# Altium footprint library GPS_GSM.PcbLib: 19 footprints (part 2 of 2)
Each footprint in its own frame and in the unit in brackets; x right, y up, seen from the top. Pads: shape width x height; smd on the part's side, far side on the other; paste and mask are expansions set on the pad; w line width, h text height; cw(c..) or ccw(c..) is an arc to the next point about the centre after c.
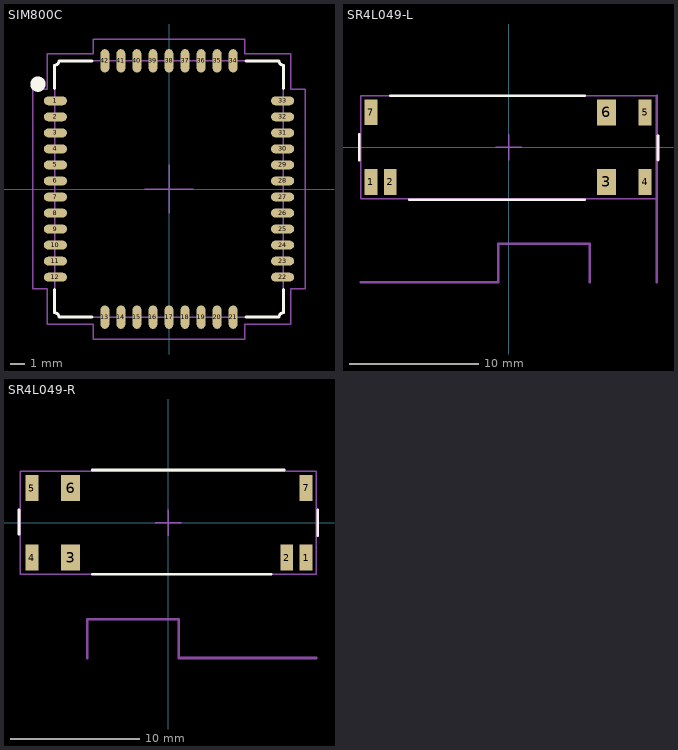
[diagram p1: the footprints below, top view; thin cyan lines are the x and y axes]

## SIM800C [mm]
pads (42):
  oval 1.6x0.6 smd mask+0.1: 1(-7.8,6.05) 2(-7.8,4.95) 3(-7.8,3.85) 4(-7.8,2.75) 5(-7.8,1.65) 6(-7.8,0.55) 7(-7.8,-0.55) 8(-7.8,-1.65) 9(-7.8,-2.75) 10(-7.8,-3.85) 11(-7.8,-4.95) 12(-7.8,-6.05) 22(7.8,-6.05) 23(7.8,-4.95) 24(7.8,-3.85) 25(7.8,-2.75) 26(7.8,-1.65) 27(7.8,-0.55) 28(7.8,0.55) 29(7.8,1.65) 30(7.8,2.75) 31(7.8,3.85) 32(7.8,4.95) 33(7.8,6.05)
  oval 0.6x1.6 smd mask+0.1: 13(-4.4,-8.8) 14(-3.3,-8.8) 15(-2.2,-8.8) 16(-1.1,-8.8) 17(0,-8.8) 18(1.1,-8.8) 19(2.2,-8.8) 20(3.3,-8.8) 21(4.4,-8.8) 34(4.4,8.8) 35(3.3,8.8) 36(2.2,8.8) 37(1.1,8.8) 38(0,8.8) 39(-1.1,8.8) 40(-2.2,8.8) 41(-3.3,8.8) 42(-4.4,8.8)
Top Overlay:
  circle w0.6: c-9,7.2 r0.224
  lines w0.2: -7.85,-6.9 -7.85,-8.5 cw(c-7.85,-8.8) -7.55,-8.8 -5.3,-8.8 ; -7.85,6.9 -7.85,8.5 ccw(c-7.85,8.8) -7.55,8.8 -5.3,8.8 ; 5.3,-8.8 7.55,-8.8 cw(c7.85,-8.8) 7.85,-8.5 7.85,-6.9 ; 5.3,8.8 7.55,8.8 ccw(c7.85,8.8) 7.85,8.5 7.85,6.9
Mechanical 15:
  lines w0.1: -1.65,0 0,0 ; 0,-1.65 0,0 ; 0,1.65 0,0 ; 1.65,0 0,0 ; -9.35,-6.85 -9.35,6.85 -8.35,6.85 -8.35,9.3 -5.2,9.3 -5.2,10.3 5.2,10.3 5.2,9.3 8.35,9.3 8.35,6.85 9.35,6.85 9.35,-6.85 8.35,-6.85 8.35,-9.3 5.2,-9.3 5.2,-10.3 -5.2,-10.3 -5.2,-9.3 -8.35,-9.3 -8.35,-6.85 -9.35,-6.85 ; -7.85,-8.5 cw(c-7.85,-8.8) -7.55,-8.8 7.55,-8.8 cw(c7.85,-8.8) 7.85,-8.5 7.85,8.5 cw(c7.85,8.8) 7.55,8.8 -7.55,8.8 cw(c-7.85,8.8) -7.85,8.5 -7.85,-8.5
3D body "SIM800C-1.STEP": height 2.35, standoff 0.01, extent -7.9,-8.8 7.8,8.8

## SR4L049-L [mm]
pads (7):
  rect 1x2 smd: 1(-10.7,-2.7) 2(-9.2,-2.7) 4(10.6,-2.7) 5(10.6,2.7) 7(-10.7,2.71)
  rect 1.5x2 smd: 3(7.6,-2.7) 6(7.6,2.7)
Top Overlay:
  lines w0.2: -11.6,-1 -11.6,1 ; -9.2,4 5.9,4 ; -7.7,-4.1 5.9,-4.1 ; 11.6,-1 11.6,0.9
Mechanical 15:
  lines w0.1: -1,0 0,0 ; 0,-1 0,0 ; 0,1 0,0 ; 1,0 0,0 ; -11.5,-4 -11.5,4 11.5,4 11.5,-4 -11.5,-4
  lines w0.2: -11.5,-10.5 -0.8,-10.5 -0.8,-7.5 6.3,-7.5 6.3,-10.5 ; 11.5,-10.5 11.5,4
3D body "SR4L049-L.STEP": height 3.31, standoff 0.02, extent -11.551,-4.009 11.449,3.991

## SR4L049-R [mm]
pads (7):
  rect 1x2 smd: 1(10.7,-2.7) 2(9.2,-2.7) 4(-10.6,-2.7) 5(-10.6,2.7) 7(10.7,2.71)
  rect 1.5x2 smd: 3(-7.6,-2.7) 6(-7.6,2.7)
Top Overlay:
  lines w0.2: -11.6,-0.9 -11.6,1 ; -5.9,-4 8,-4 ; -5.9,4.1 9,4.1 ; 11.6,-1 11.6,1
Mechanical 15:
  lines w0.1: -1,0 0,0 ; 0,-1 0,0 ; 0,1 0,0 ; 1,0 0,0 ; -11.5,-4 -11.5,4 11.5,4 11.5,-4 -11.5,-4
  lines w0.2: -6.3,-10.5 -6.3,-7.5 0.8,-7.5 0.8,-10.5 11.5,-10.5
3D body "SR4L049-R.STEP": height 3.29, standoff 0, extent -11.5,-4 11.5,4